# Altium footprint library SG_PCB_Fomin.PcbLib: 74 footprints (part 4 of 5)
Each footprint in its own frame and in the unit in brackets; x right, y up, seen from the top. Pads: shape width x height; smd on the part's side, far side on the other; paste and mask are expansions set on the pad; w line width, h text height; cw(c..) or ccw(c..) is an arc to the next point about the centre after c.
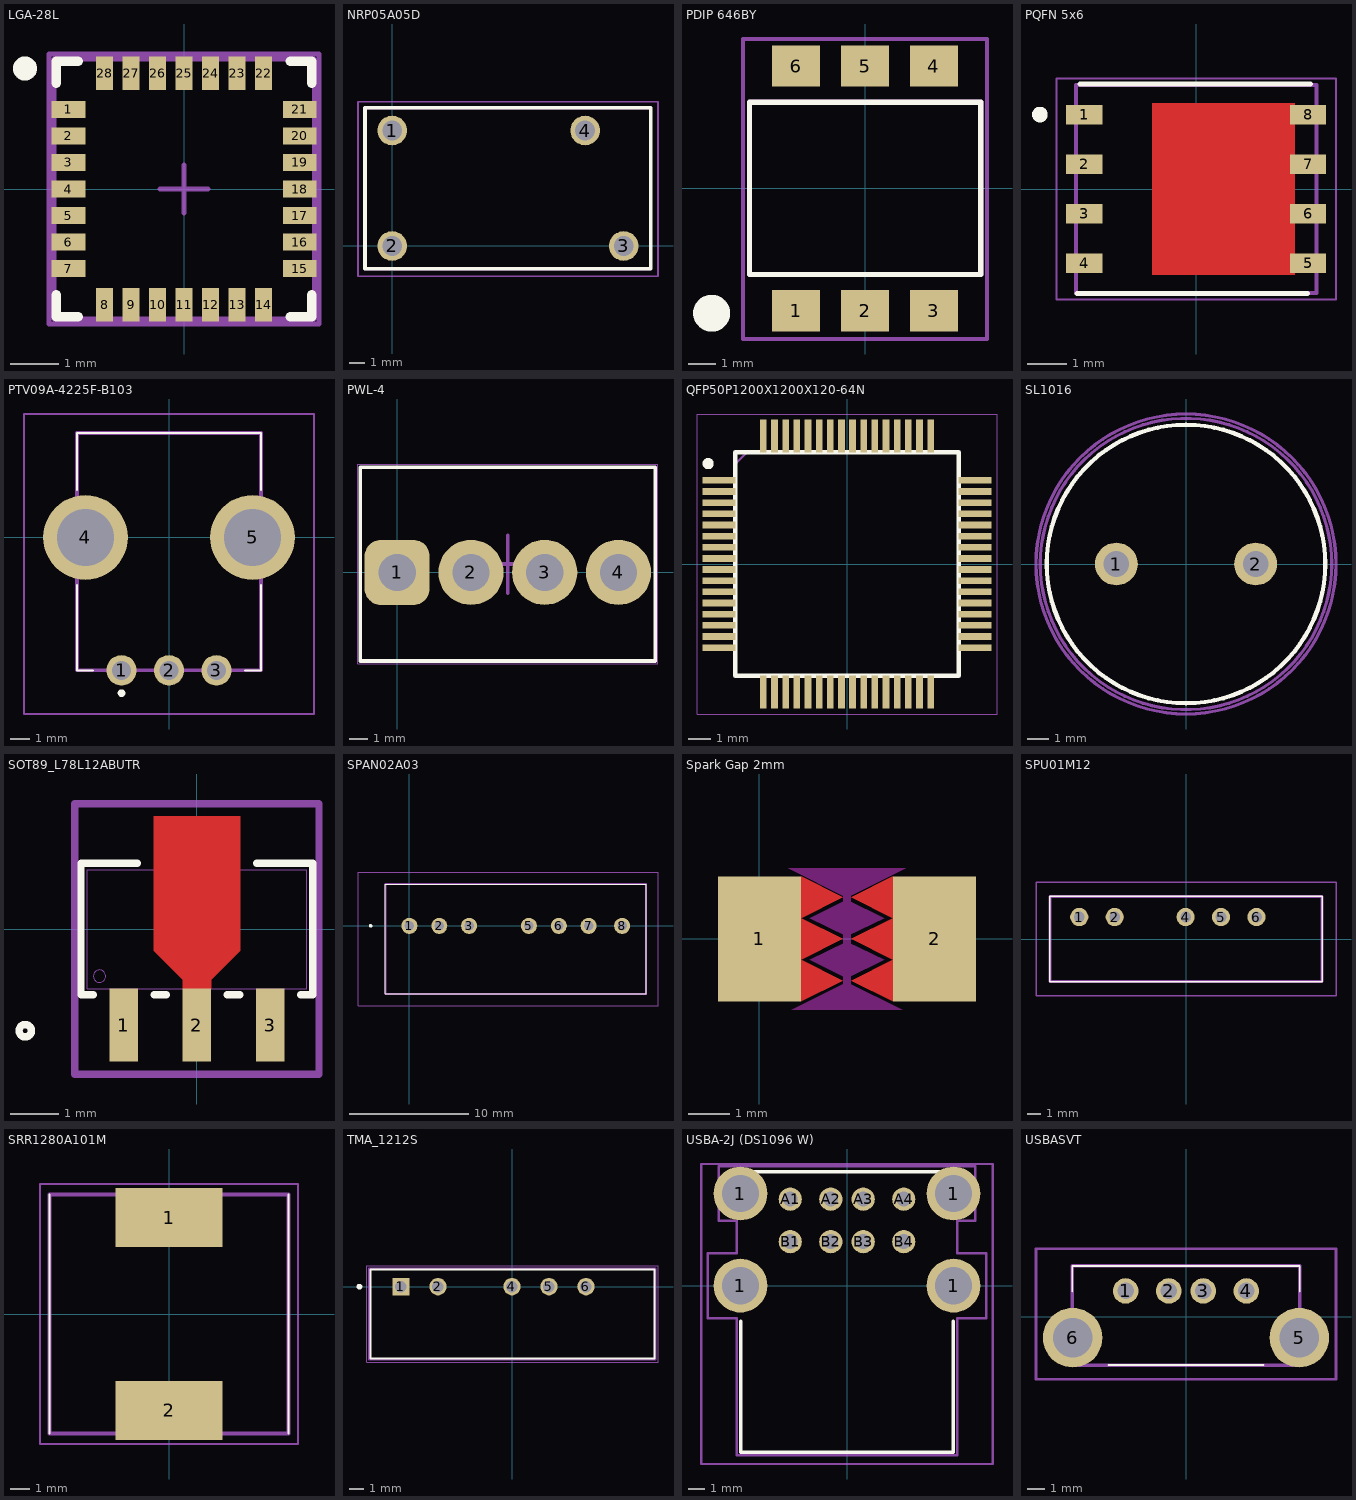
[diagram p3: the footprints below, top view; thin cyan lines are the x and y axes]

## LGA-28L [mm] "QFN, 28-Leads, Body 5,00x5,00mm, Pitch 0,55mm, Thermal Pad 3,60x3,60mm, IPC Medium Density"
height 1
pads (28):
  rect 0.7x0.35 smd: 1(-2.4,1.65) 2(-2.4,1.1) 3(-2.4,0.55) 4(-2.4,0) 5(-2.4,-0.55) 6(-2.4,-1.1) 7(-2.4,-1.65) 15(2.4,-1.65) 16(2.4,-1.1) 17(2.4,-0.55) 18(2.4,0) 19(2.4,0.55) 20(2.4,1.1) 21(2.4,1.65)
  rect 0.35x0.7 smd: 8(-1.65,-2.4) 9(-1.1,-2.4) 10(-0.55,-2.4) 11(0,-2.4) 12(0.55,-2.4) 13(1.1,-2.4) 14(1.65,-2.4) 22(1.65,2.4) 23(1.1,2.4) 24(0.55,2.4) 25(0,2.4) 26(-0.55,2.4) 27(-1.1,2.4) 28(-1.65,2.4)
Top Overlay:
  circle w0.25: c-3.3,2.5 r0.125
  lines w0.2: -2.65,-2.2 -2.65,-2.65 -2.2,-2.65 ; -2.65,2.2 -2.65,2.65 -2.2,2.65 ; 2.2,-2.65 2.65,-2.65 2.65,-2.2 ; 2.2,2.65 2.65,2.65 2.65,2.2
Top Assembly:
  lines w0.1: -2.7,-2.7 2.7,-2.7 2.7,2.7 -2.7,2.7 -2.7,-2.7
Top Courtyard:
  lines w0.1: -0.5,0 0.5,0 ; 0,-0.5 0,0.5 ; -2.8,-2.8 2.8,-2.8 2.8,2.8 -2.8,2.8 -2.8,-2.8
Top Designator:
  text ".Designator" at -7.843,-0.508 h1.52
3D body "QFN55P500X500X100_HS-29N.step": height 1, standoff 0, extent -2.7,-2.7 2.7,2.7

## NRP05A05D [mm]
pads (4):
  round 1.95 hole 1.3: 1(0,7.6) 2(0,0) 3(15.24,0) 4(12.7,7.6)
Top Overlay:
  lines w0.25: -1.78,-1.5 17.02,-1.5 17.02,9.1 -1.78,9.1 -1.78,-1.5
Top Assembly:
  lines w0.2: -1.78,-1.5 17.02,-1.5 17.02,9.1 -1.78,9.1 -1.78,-1.5
Top Courtyard:
  lines w0.1: -2.25,-2 -2.25,9.5 17.5,9.5 17.5,-2 -2.25,-2
Top Designator:
  text ".Designator" at 4.2,3.467 h0.8
3D body "NRP05-A-05D.stp": height 16.1, standoff -5, extent -1.78,-1.5 17.02,9.1

## PDIP 646BY [mm] "Logic Output Opto-couplers"
pads (6):
  rect 1.78x1.52 smd: 1(-2.54,-4.505) 2(0,-4.505) 3(2.54,-4.505) 4(2.54,4.505) 5(0,4.505) 6(-2.54,4.505)
Top Overlay:
  circle w1: c-5.65,-4.6 r0.178
  lines w0.2: -4.255,-3.175 4.255,-3.175 4.255,3.175 -4.255,3.175 -4.255,-3.175
Top Assembly:
  lines w0.2: -4.255,-3.175 4.255,-3.175 4.255,3.175 -4.255,3.175 -4.255,-3.175
Top Courtyard:
  lines w0.15: -4.5,-5.55 4.5,-5.55 4.5,5.5 -4.5,5.5 -4.5,-5.55
Top Designator:
  text ".Designator" at -4.3,-0.298 h0.8
3D body "H11L1SM.stp": height 4.8, standoff 0, extent -4.255,-4.583 4.255,4.583

## PQFN 5x6 [mm]
pads (8):
  rect 0.925x0.5 smd: 1(-2.865,1.905) 2(-2.865,0.635) 3(-2.865,-0.635) 4(-2.865,-1.905) 5(2.865,-1.905) 6(2.865,-0.635) 7(2.865,0.635) 8(2.865,1.905)
Top Layer:
  rectangle: -1.13,-2.205 2.525,2.205
Top Overlay:
  circle w0.2: c-4,1.905 r0.1
  lines w0.127: -3.05,-2.675 2.85,-2.675 ; -2.974,2.684 2.926,2.684
Top Paste:
  region: 2.325,-1.6 0.825,-1.6 0.825,-0.1 2.325,-0.1
  region: 2.325,0.1 0.825,0.1 0.825,1.6 2.325,1.6
  region: 0.625,0.1 -0.875,0.1 -0.875,1.6 0.625,1.6
  region: 0.625,-1.6 -0.875,-1.6 -0.875,-0.1 0.625,-0.1
Top Solder:
  rectangle: -1.198,-2.259 2.525,2.259
Top Courtyard:
  lines w0.05: -3.58,-2.825 3.58,-2.825 3.58,2.825 -3.58,2.825 -3.58,-2.825
  lines w0.2: -1,0 1,0 ; 0,-1 0,1
Top 3D Body:
  lines w0.1: -3.08,-2.668 3.08,-2.668 3.08,2.668 -3.08,2.668 -3.08,-2.668
Top Designator:
  text ".Designator" at -4.5,-0.467 h1
3D body "IRFH7545TRPBF.STEP": height 1.2, standoff 0, extent -3.08,-2.668 3.08,2.668

## PTV09A-4225F-B103 [mm] "Potentiometer"
pads (5):
  round 1.6 hole 1: 1(-2.5,-7) 2(0,-7) 3(2.5,-7)
  round 4.46 hole 3: 4(-4.4,0) 5(4.4,0)
Top Overlay:
  lines w0.1: -4.85,-2.5 -4.85,-7 -4,-7 ; -4.85,2.5 -4.85,5.5 4.85,5.5 4.85,2.5 ; 4,-7 4.85,-7 4.85,-2.5
  lines w0.2: -2.6,-8.2 cw(c-2.5,-8.2) -2.4,-8.2 cw(c-2.5,-8.2) -2.6,-8.2
Top Assembly:
  lines w0.2: -4.85,-7 4.85,-7 4.85,5.5 -4.85,5.5 -4.85,-7
Top Courtyard:
  lines w0.1: -7.63,-9.3 7.63,-9.3 7.63,6.5 -7.63,6.5 -7.63,-9.3
Top Designator:
  text ".Designator" at -6.946,-1.038 h1.52
3D body "PTV09A-4225F-B104.stp": height 25.35, standoff -3.39, extent -5.477,-7.627 5.477,4.825

## PWL-4 [mm]
height 12
pads (4):
  rrect50% 3.5x3.5 hole 2: 1(0,0)
  round 3.5 hole 2: 2(3.96,0) 3(7.92,0) 4(11.88,0)
Top Overlay:
  lines w0.2: -1.984,-4.755 -1.984,5.645 13.856,5.645 13.856,-4.755 -1.984,-4.755
Top Assembly:
  lines w0.1: -1.984,-4.755 13.856,-4.755 13.856,5.645 -1.984,5.645 -1.984,-4.755
Top Courtyard:
  lines w0.05: -2.1,-4.9 -2.1,5.8 10,5.8 14,5.8 14,-3 14,-4.9 -0.9,-4.9 -2.1,-4.9
  lines w0.2: 4.38,0.445 5.936,0.445 ; 5.936,-1.11 5.936,0.445 ; 5.936,2 5.936,0.445 ; 7.491,0.445 5.936,0.445
Top Designator:
  text ".Designator" at -1.946,2.362 h1.52
3D body "User Library-PWL-4.step": height 13.8, standoff -3.6, extent -1.984,-4.755 13.856,5.645

## QFP50P1200X1200X120-64N [mm]
pads (64):
  rect 1.475x0.3 smd: 1(-5.738,3.75) 2(-5.738,3.25) 3(-5.738,2.75) 4(-5.738,2.25) 5(-5.738,1.75) 6(-5.738,1.25) 7(-5.738,0.75) 8(-5.738,0.25) 9(-5.738,-0.25) 10(-5.738,-0.75) 11(-5.738,-1.25) 12(-5.738,-1.75) 13(-5.738,-2.25) 14(-5.738,-2.75) 15(-5.738,-3.25) 16(-5.738,-3.75) 33(5.738,-3.75) 34(5.738,-3.25) 35(5.738,-2.75) 36(5.738,-2.25) 37(5.738,-1.75) 38(5.738,-1.25) 39(5.738,-0.75) 40(5.738,-0.25) 41(5.738,0.25) 42(5.738,0.75) 43(5.738,1.25) 44(5.738,1.75) 45(5.738,2.25) 46(5.738,2.75) 47(5.738,3.25) 48(5.738,3.75)
  rect 0.3x1.475 smd: 17(-3.75,-5.738) 18(-3.25,-5.738) 19(-2.75,-5.738) 20(-2.25,-5.738) 21(-1.75,-5.738) 22(-1.25,-5.738) 23(-0.75,-5.738) 24(-0.25,-5.738) 25(0.25,-5.738) 26(0.75,-5.738) 27(1.25,-5.738) 28(1.75,-5.738) 29(2.25,-5.738) 30(2.75,-5.738) 31(3.25,-5.738) 32(3.75,-5.738) 49(3.75,5.738) 50(3.25,5.738) 51(2.75,5.738) 52(2.25,5.738) 53(1.75,5.738) 54(1.25,5.738) 55(0.75,5.738) 56(0.25,5.738) 57(-0.25,5.738) 58(-0.75,5.738) 59(-1.25,5.738) 60(-1.75,5.738) 61(-2.25,5.738) 62(-2.75,5.738) 63(-3.25,5.738) 64(-3.75,5.738)
Top Overlay:
  circle w0.25: c-6.225,4.5 r0.125
  lines w0.2: -5,-5 -5,5 5,5 5,-5 -5,-5
Top Assembly:
  lines w0.1: -5,4.5 -4.5,5 ; -5,-5 -5,5 5,5 5,-5 -5,-5
Top Courtyard:
  lines w0.05: -6.725,-6.725 -6.725,6.725 6.725,6.725 6.725,-6.725 -6.725,-6.725
3D body "TMDS261BPAG.stp": height 1.09, standoff 0, extent -6,-6 6,6

## SL1016 [mm] "radial inductor"
pads (2):
  round 2 hole 1.2: 1(-3.25,0) 2(3.25,0)
Top Overlay:
  circle w0.2: c0,0 r6.5
Top Assembly:
  circle w0.15: c0,0 r6.8
Top Courtyard:
  circle w0.15: c0,0 r7
Top Designator:
  text ".Designator" at -7.246,-0.488 h1.52

## SOT89_L78L12ABUTR [mil]
pads (3):
  rect 23x59 smd paste+0 mask+0: 1(-59.06,-77.5) 2(0,-77.5) 3(59.06,-77.5)
Top Layer:
  region: 11.5,-48 -11.5,-48 -11.5,-41 -35,-17.5 -35,91 35,91 35,-17.5 11.5,-41
Top Overlay:
  circle w6: c-138.5,-82 r5
  lines w6: -83.66,-53 -93.5,-53 -93.5,53 -48.1,53 ; -34.46,-53 -24.6,-53 ; 24.6,-53 34.46,-53 ; 48.1,53 93.5,53 93.5,-53 83.66,-53
Top Paste:
  region: 11.5,-49 -11.5,-49 -11.5,-41 -35,-17.5 -35,81 35,81 35,-17.5 11.5,-41
Top Solder:
  region: 11.5,-49 -11.5,-49 -11.5,-41 -35,-17.5 -35,81 35,81 35,-17.5 11.5,-41
Top Assembly:
  circle w0: c-78.5,-38 r5
  lines w1: -88.5,-48 88.5,-48 88.5,48 -88.5,48 -88.5,-48 ; -69.56,-95 -48.56,-95 -48.56,-48 -69.56,-48 -69.56,-95 ; -10.5,-95 10.5,-95 10.5,-48 -10.5,-48 -10.5,-95 ; 48.56,-95 69.56,-95 69.56,-48 48.56,-48 48.56,-95
Top Courtyard:
  lines w3.94: -29.53,0 29.53,0 ; 0,-29.53 0,29.53
  lines w6: -98.43,-117 98.5,-117 98.5,-58 98.5,101 44,101 -44,101 -98.43,101 -98.43,-58 -98.43,-117
Top Designator:
  text ".Designator" at -322.4,-27.99 h60
3D body "SOT89_4P5X2P45_DIO.step": height 65.12, standoff 0, extent -88.5,-95 88.51,69.02

## SPAN02A03 [mm]
pads (7):
  round 1.342 hole 0.783: 1(0,0) 2(2.5,0) 3(5,0) 5(10,0) 6(12.5,0) 7(15,0) 8(17.8,0)
Top Overlay:
  lines w0.1: -2,-5.7 19.8,-5.7 19.8,3.5 -2,3.5 -2,-5.7
  lines w0.2: -3.3,0 ccw(c-3.25,0) -3.2,0 ; -3.3,0 cw(c-3.25,0) -3.2,0 ; -3.3,0 ccw(c-3.25,0) -3.2,0
Mechanical 13:
  lines w0.2: -2,-5.7 19.8,-5.7 19.8,3.5 -2,3.5 -2,-5.7
Mechanical 15:
  lines w0.1: -4.3,-6.7 20.8,-6.7 20.8,4.5 -4.3,4.5 -4.3,-6.7
3D body "SPAN02A-03.stp": height 11.2, standoff -5, extent -2,-5.7 19.8,3.5

## Spark Gap 2mm [mm]
pads (2):
  rect 2x3 smd mask+0.102: 1(0,0) 2(4.2,0)
Top Layer:
  region: 1,1.5 2,1 1,0.5
  region: 1,0.5 2,0 1,-0.5
  region: 1,-0.5 2,-1 1,-1.5
  region: 3.2,1.5 2.2,1 3.2,0.5
  region: 3.2,0.5 2.2,0 3.2,-0.5
  region: 3.2,-0.5 2.2,-1 3.2,-1.5
Top Layer keep-out:
  rectangle: 2,-1.3 2.2,1.3
  region: 1.2,-0.5 2.095,-0.94 3,-0.5 2.095,-0.063
  region: 1.2,0.5 2.095,0.06 3,0.5 2.095,0.937
  region: 0.685,1.7 2.098,0.996 3.511,1.7
  region: 0.772,-1.7 2.1,-1.038 3.428,-1.7
Top Paste:
  region: 3.2,0.5 3.2,-0.5 2.2,0
  region: 3.2,-1.5 2.2,-1 3.2,-0.5
  region: 3.2,1.5 2.2,1 3.2,0.5
  region: 1,-1.5 2,-1 1,-0.5
  region: 1,0.5 1,-0.5 2,0
  region: 1,1.5 2,1 1,0.5
Top Solder:
  region: 1,-0.5 2,-1 1,-1.5
  region: 1,0.5 2,0 1,-0.5
  region: 1,1.5 2,1 1,0.5
  region: 3.2,1.5 2.2,1 3.2,0.5
  region: 3.2,0.5 2.2,0 3.2,-0.5
  region: 3.2,-0.5 2.2,-1 3.2,-1.5

## SPU01M12 [mm]
pads (5):
  round 1.303 hole 0.76: 1(-7.65,1.575) 2(-5.11,1.575) 4(-0.03,1.575) 5(2.51,1.575) 6(5.05,1.575)
Top Overlay:
  lines w0.1: -9.75,-3.05 -9.75,3.05 9.75,3.05 9.75,-3.05 -9.75,-3.05
Top Assembly:
  lines w0.2: -9.75,-3.05 -9.75,3.05 9.75,3.05 9.75,-3.05 -9.75,-3.05
Top Courtyard:
  lines w0.1: -10.75,-4.05 10.75,-4.05 10.75,4.05 -10.75,4.05 -10.75,-4.05
3D body "SPU01M-12.stp": height 10.1, standoff -5, extent -9.75,-3.05 9.75,3.05

## SRR1280A101M [mm]
pads (2):
  rect 5.6x3.1 smd: 1(0,5.05) 2(0,-5.05)
Top Overlay:
  lines w0.1: -6.25,-6.25 -6.25,6.25 ; 6.25,-6.25 6.25,6.25
Top Assembly:
  lines w0.2: -6.25,-6.25 6.25,-6.25 6.25,6.25 -6.25,6.25 -6.25,-6.25
Top Courtyard:
  lines w0.1: -6.75,-6.8 6.75,-6.8 6.75,6.8 -6.75,6.8 -6.75,-6.8
3D body "SRR1280-100M.stp": height 7.5, standoff 0, extent -6.25,-6.25 6.25,6.25

## TMA_1212S [mm]
pads (5):
  rect 1.19x1.19 hole 0.79: 1(-7.65,0)
  round 1.19 hole 0.79: 2(-5.11,0) 4(-0.03,0) 5(2.51,0) 6(5.05,0)
Top Overlay:
  circle w0.2: c-10.5,0 r0.1
  lines w0.127: -9.75,-4.927 -9.75,1.173 9.75,1.173 9.75,-4.927 -9.75,-4.927
Top Assembly:
  lines w0.15: -9.825,-5 -9.825,1.25 9.825,1.25 9.825,-5 -9.825,-5
Top Courtyard:
  lines w0.05: -10,-5.177 -10,1.423 10,1.423 10,-5.177 -10,-5.177
Top Designator:
  text ".Designator" at -7.955,-2.385 h1.52
3D body "tma_1212s.stp": height 10.2, standoff -3.2, extent -9.75,-4.925 9.75,1.175

## USBA-2J (DS1096 W) [mm] "Double USB"
pads (12):
  round 3.316 hole 2.3: 1(-6.57,0) 1(-6.57,5.68) 1(6.57,0) 1(6.57,5.68)
  round 1.428 hole 0.92: A1(-3.5,5.33) A2(-1,5.33) A3(1,5.33) A4(3.5,5.33) B1(-3.5,2.71) B2(-1,2.71) B3(1,2.71) B4(3.5,2.71)
Top Overlay:
  lines w0.2: -6.55,-2.2 -6.55,-10.28 6.55,-10.28 6.55,-2.2 ; -6.55,7.02 6.55,7.02
Top Assembly:
  lines w0.15: -8.6,-2 -6.8,-2 -6.8,-10.45 6.8,-10.45 6.8,-2 8.6,-2 8.6,2 6.8,2 6.8,4 7.9,4 7.9,7.35 -7.9,7.35 -7.9,4 -6.8,4 -6.8,2 -8.6,2 -8.6,-2
Top Courtyard:
  lines w0.15: -9,-11 9,-11 9,7.5 -9,7.5 -9,-11
Top Designator:
  text ".Designator" at -7.246,-2.738 h1.52
3D body "723098034blf.stp": height 16.19, standoff -2.79, extent -7.5,-11.009 7.5,7.009

## USBASVT [mm]
pads (6):
  round 1.478 hole 0.95: 1(-3.5,1.5) 2(-1,1.5) 3(1,1.5) 4(3.5,1.5)
  round 3.45 hole 2.3: 5(6.57,-1.21) 6(-6.57,-1.21)
Top Overlay:
  lines w0.1: -6.6,1.45 -6.6,2.95 6.6,2.95 6.6,1.45 ; -4.5,-2.8 4.5,-2.8
Top Assembly:
  lines w0.2: -6.6,-2.8 6.6,-2.8 6.6,2.95 -6.6,2.95 -6.6,-2.8
Top Courtyard:
  lines w0.15: -8.7,-3.625 8.7,-3.625 8.7,3.95 -8.7,3.95 -8.7,-3.625
Top Designator:
  text ".Designator" at -7.246,-0.238 h1.52
3D body "UE27AE5410H--3DModel-STEP-533217.step": height 14, standoff -4.33, extent -7.95,-3.443 7.95,3.677